# Altium footprint library ref-packages.PCBLIB: 1544 footprints (part 41 of 103)
Each footprint in its own frame and in the unit in brackets; x right, y up, seen from the top. Pads: shape width x height; smd on the part's side, far side on the other; paste and mask are expansions set on the pad; w line width, h text height; cw(c..) or ccw(c..) is an arc to the next point about the centre after c.
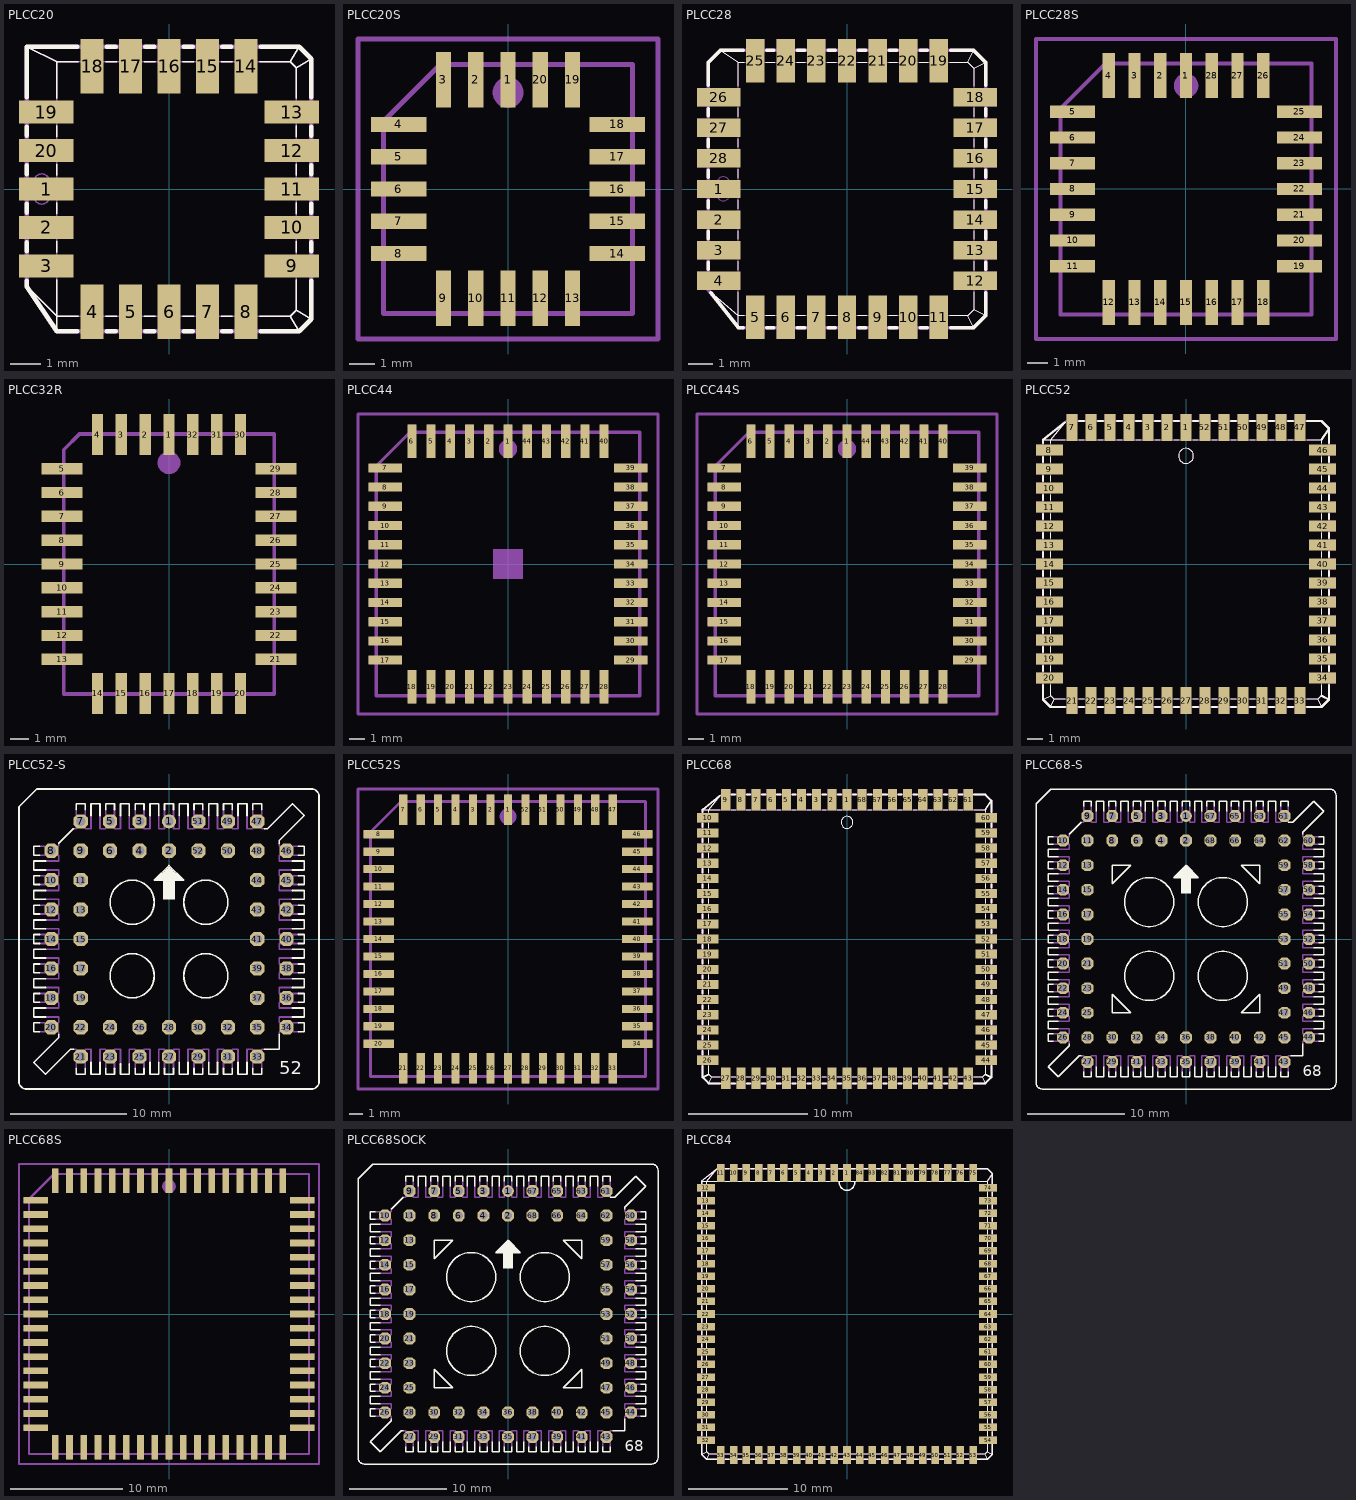
[diagram p40: the footprints below, top view; thin cyan lines are the x and y axes]

## PLCC20 [mil]
pads (20):
  rect 70.87x29.92 smd: 1(-159.45,0) 2(-159.45,-50) 3(-159.45,-100) 9(159.45,-100) 10(159.45,-50) 11(159.45,0) 12(159.45,50) 13(159.45,100) 19(-159.45,100) 20(-159.45,50)
  rect 29.92x70.87 smd: 4(-100,-159.45) 5(-50,-159.45) 6(0,-159.45) 7(50,-159.45) 8(100,-159.45) 14(100,159.45) 15(50,159.45) 16(0,159.45) 17(-50,159.45) 18(-100,159.45)
Top Overlay:
  lines w2: -185.04,185.04 -145.67,165.35 ; -184.65,-126.38 -145.67,-165.35 ; -145.67,-184.65 -145.67,-165.35 ; -145.67,-117.76 -145.67,-165.35 ; -145.67,-82.24 -145.67,-67.76 ; -145.67,-32.24 -145.67,-17.76 ; -145.67,17.76 -145.67,32.24 ; -145.67,67.76 -145.67,82.24 ; -145.67,117.76 -145.67,165.35 ; -117.76,-165.35 -145.67,-165.35 ; -117.76,165.35 -145.67,165.35 ; -82.24,-165.35 -67.76,-165.35 ; -82.24,165.35 -67.76,165.35 ; -32.24,-165.35 -17.76,-165.35 ; -32.24,165.35 -17.76,165.35 ; 17.76,-165.35 32.24,-165.35 ; 17.76,165.35 32.24,165.35 ; 67.76,-165.35 82.24,-165.35 ; 67.76,165.35 82.24,165.35 ; 117.76,-165.35 157.48,-165.35 ; 117.76,165.35 157.48,165.35 ; 165.35,-117.76 165.35,-157.48 ; 165.35,-82.24 165.35,-67.76 ; 165.35,-32.24 165.35,-17.76 ; 165.35,17.76 165.35,32.24 ; 165.35,67.76 165.35,82.24 ; 165.35,117.76 165.35,157.48 ; 169.29,-185.04 157.48,-165.35 ; 169.29,185.04 157.48,165.35 ; 185.04,-169.29 165.35,-157.48 ; 185.04,169.29 165.35,157.48 ; 157.48,-165.35 165.35,-157.48 ; 157.48,165.35 165.35,157.48
  lines w6: -185.04,-119.33 -185.04,-126.38 -145.67,-185.04 -119.33,-185.04 ; -185.04,-80.67 -185.04,-69.33 ; -185.04,-30.67 -185.04,-19.33 ; -185.04,19.33 -185.04,30.67 ; -185.04,69.33 -185.04,80.67 ; -185.04,119.33 -185.04,185.04 -119.33,185.04 ; -80.67,-185.04 -69.33,-185.04 ; -80.67,185.04 -69.33,185.04 ; -30.67,-185.04 -19.33,-185.04 ; -30.67,185.04 -19.33,185.04 ; 19.33,-185.04 30.67,-185.04 ; 19.33,185.04 30.67,185.04 ; 69.33,-185.04 80.67,-185.04 ; 69.33,185.04 80.67,185.04 ; 119.33,-185.04 169.29,-185.04 185.04,-169.29 185.04,-119.33 ; 119.33,185.04 169.29,185.04 185.04,169.29 185.04,119.33 ; 185.04,-80.67 185.04,-69.33 ; 185.04,-30.67 185.04,-19.33 ; 185.04,19.33 185.04,30.67 ; 185.04,69.33 185.04,80.67
Mechanical 16:
  rectangle: -109.84,-194.88 -90.16,-185.04
  rectangle: -109.84,185.04 -90.16,194.88
  rectangle: -59.84,185.04 -40.16,194.88
  rectangle: -9.84,185.04 9.84,194.88
  rectangle: 40.16,185.04 59.84,194.88
  rectangle: 90.16,185.04 109.84,194.88
  rectangle: 40.16,185.04 59.84,194.88
  rectangle: -9.84,185.04 9.84,194.88
  rectangle: 185.04,90.16 194.88,109.84
  rectangle: 185.04,40.16 194.88,59.84
  rectangle: 185.04,-9.84 194.88,9.84
  rectangle: 185.04,-59.84 194.88,-40.16
  rectangle: 185.04,-109.84 194.88,-90.16
  rectangle: -59.84,-194.88 -40.16,-185.04
  rectangle: -9.84,-194.88 9.84,-185.04
  rectangle: 40.16,-194.88 59.84,-185.04
  rectangle: 90.16,-194.88 109.84,-185.04
  rectangle: -194.88,90.16 -185.04,109.84
  rectangle: -194.88,40.16 -185.04,59.84
  rectangle: -194.88,-9.84 -185.04,9.84
  rectangle: -194.88,-59.84 -185.04,-40.16
  rectangle: -194.88,-109.84 -185.04,-90.16
  lines w2: -185.04,-125.98 -145.67,-165.35 ; -185.04,185.04 -145.67,165.35 ; 169.29,-185.04 157.48,-165.35 ; 169.29,185.04 157.48,165.35 ; 185.04,-169.29 165.35,-157.48 ; 185.04,169.29 165.35,157.48 ; -145.67,-165.35 157.48,-165.35 ; -145.67,-165.35 -145.67,165.35 ; -145.67,165.35 157.48,165.35 ; 157.48,-165.35 165.35,-157.48 ; 157.48,165.35 165.35,157.48 ; 165.35,-157.48 165.35,157.48 ; -175.2,-9.84 ccw(c-165.35,-9.84) -155.51,-9.84 -155.51,9.84 ccw(c-165.35,9.84) -175.2,9.84 -175.2,-9.84
  lines w6: -185.04,-125.98 -185.04,185.04 169.29,185.04 185.04,169.29 185.04,-169.29 169.29,-185.04 -145.67,-185.04 -185.04,-125.98

## PLCC20S [mil]
pads (20):
  rect 23.62x86.61 smd: 1(0,169.29) 2(-50,169.29) 3(-100,169.29) 9(-100,-169.29) 10(-50,-169.29) 11(0,-169.29) 12(50,-169.29) 13(100,-169.29) 19(100,169.29) 20(50,169.29)
  rect 86.61x23.62 smd: 4(-169.29,100) 5(-169.29,50) 6(-169.29,0) 7(-169.29,-50) 8(-169.29,-100) 14(169.29,-100) 15(169.29,-50) 16(169.29,0) 17(169.29,50) 18(169.29,100)
Mechanical 16:
  circle w24: c0,149.61 r11.81
  rectangle: -10.24,194.88 10.24,212.6
  rectangle: -60.24,194.88 -39.76,212.6
  rectangle: -110.24,194.88 -89.76,212.6
  rectangle: -212.6,89.76 -194.88,110.24
  rectangle: -212.6,39.76 -194.88,60.24
  rectangle: -212.6,-10.24 -194.88,10.24
  rectangle: -212.6,-60.24 -194.88,-39.76
  rectangle: -212.6,-110.24 -194.88,-89.76
  rectangle: -110.24,-212.6 -89.76,-194.88
  rectangle: -60.24,-212.6 -39.76,-194.88
  rectangle: -10.24,-212.6 10.24,-194.88
  rectangle: 39.76,-212.6 60.24,-194.88
  rectangle: 89.76,-212.6 110.24,-194.88
  rectangle: 194.88,-110.24 212.6,-89.76
  rectangle: 194.88,-60.24 212.6,-39.76
  rectangle: 194.88,-10.24 212.6,10.24
  rectangle: 194.88,39.76 212.6,60.24
  rectangle: 194.88,89.76 212.6,110.24
  rectangle: 89.76,194.88 110.24,212.6
  rectangle: 39.76,194.88 60.24,212.6
  lines w8: -192.91,-192.91 -192.91,104.92 -104.92,192.91 192.91,192.91 192.91,-192.91 -192.91,-192.91
Mechanical 27:
  lines w7.87: -232.4,-232.4 232.4,-232.4 232.4,232.4 -232.4,232.4 -232.4,-232.4

## PLCC28 [mil]
pads (28):
  rect 70.87x29.92 smd: 1(-209.45,0) 2(-209.45,-50) 3(-209.45,-100) 4(-209.45,-150) 12(209.45,-150) 13(209.45,-100) 14(209.45,-50) 15(209.45,0) 16(209.45,50) 17(209.45,100) 18(209.45,150) 26(-209.45,150) 27(-209.45,100) 28(-209.45,50)
  rect 29.92x70.87 smd: 5(-150,-209.45) 6(-100,-209.45) 7(-50,-209.45) 8(0,-209.45) 9(50,-209.45) 10(100,-209.45) 11(150,-209.45) 19(150,209.45) 20(100,209.45) 21(50,209.45) 22(0,209.45) 23(-50,209.45) 24(-100,209.45) 25(-150,209.45)
Top Overlay:
  lines w2: -223.58,-167.76 -177.17,-206.69 ; -206.69,226.38 -177.17,206.69 ; -177.17,-226.38 -177.17,-206.69 ; -177.17,-167.76 -177.17,-206.69 ; -177.17,-132.24 -177.17,-117.76 ; -177.17,-82.24 -177.17,-67.76 ; -177.17,-32.24 -177.17,-17.76 ; -177.17,17.76 -177.17,32.24 ; -177.17,67.76 -177.17,82.24 ; -177.17,117.76 -177.17,132.24 ; -177.17,167.76 -177.17,206.69 ; -167.76,-206.69 -177.17,-206.69 ; -167.76,206.69 -177.17,206.69 ; -132.24,-206.69 -117.76,-206.69 ; -132.24,206.69 -117.76,206.69 ; -82.24,-206.69 -67.76,-206.69 ; -82.24,206.69 -67.76,206.69 ; -32.24,-206.69 -17.76,-206.69 ; -32.24,206.69 -17.76,206.69 ; 17.76,-206.69 32.24,-206.69 ; 17.76,206.69 32.24,206.69 ; 67.76,-206.69 82.24,-206.69 ; 67.76,206.69 82.24,206.69 ; 117.76,-206.69 132.24,-206.69 ; 117.76,206.69 132.24,206.69 ; 167.76,-206.69 196.85,-206.69 ; 167.76,206.69 196.85,206.69 ; 206.69,-226.38 196.85,-206.69 ; 206.69,-167.76 206.69,-196.85 ; 206.69,-132.24 206.69,-117.76 ; 206.69,-82.24 206.69,-67.76 ; 206.69,-32.24 206.69,-17.76 ; 206.69,17.76 206.69,32.24 ; 206.69,67.76 206.69,82.24 ; 206.69,117.76 206.69,132.24 ; 206.69,167.76 206.69,196.85 ; 206.69,226.38 196.85,206.69 ; 226.38,-206.69 206.69,-196.85 ; 226.38,206.69 206.69,196.85 ; 196.85,-206.69 206.69,-196.85 ; 196.85,206.69 206.69,196.85
  lines w6: -226.38,-130.67 -226.38,-119.33 ; -226.38,-80.67 -226.38,-69.33 ; -226.38,-30.67 -226.38,-19.33 ; -226.38,19.33 -226.38,30.67 ; -226.38,69.33 -226.38,80.67 ; -226.38,119.33 -226.38,130.67 ; -226.38,169.33 -226.38,206.69 -206.69,226.38 -169.33,226.38 ; -222.4,-169.33 -177.17,-226.38 -169.33,-226.38 ; -130.67,-226.38 -119.33,-226.38 ; -130.67,226.38 -119.33,226.38 ; -80.67,-226.38 -69.33,-226.38 ; -80.67,226.38 -69.33,226.38 ; -30.67,-226.38 -19.33,-226.38 ; -30.67,226.38 -19.33,226.38 ; 19.33,-226.38 30.67,-226.38 ; 19.33,226.38 30.67,226.38 ; 69.33,-226.38 80.67,-226.38 ; 69.33,226.38 80.67,226.38 ; 119.33,-226.38 130.67,-226.38 ; 119.33,226.38 130.67,226.38 ; 169.33,-226.38 206.69,-226.38 226.38,-206.69 226.38,-169.33 ; 169.33,226.38 206.69,226.38 226.38,206.69 226.38,169.33 ; 226.38,-130.67 226.38,-119.33 ; 226.38,-80.67 226.38,-69.33 ; 226.38,-30.67 226.38,-19.33 ; 226.38,19.33 226.38,30.67 ; 226.38,69.33 226.38,80.67 ; 226.38,119.33 226.38,130.67
Mechanical 16:
  rectangle: -164.96,226.38 -135.04,244.88
  rectangle: -114.96,226.38 -85.04,244.88
  rectangle: -64.96,226.38 -35.04,244.88
  rectangle: -14.96,226.38 14.96,244.88
  rectangle: 35.04,226.38 64.96,244.88
  rectangle: 85.04,226.38 114.96,244.88
  rectangle: 135.04,226.38 164.96,244.88
  rectangle: 226.38,135.04 244.88,164.96
  rectangle: 226.38,85.04 244.88,114.96
  rectangle: 226.38,35.04 244.88,64.96
  rectangle: 226.38,-14.96 244.88,14.96
  rectangle: 226.38,-64.96 244.88,-35.04
  rectangle: 226.38,-114.96 244.88,-85.04
  rectangle: 226.38,-164.96 244.88,-135.04
  rectangle: -164.96,-244.88 -135.04,-226.38
  rectangle: -114.96,-244.88 -85.04,-226.38
  rectangle: -64.96,-244.88 -35.04,-226.38
  rectangle: -14.96,-244.88 14.96,-226.38
  rectangle: 35.04,-244.88 64.96,-226.38
  rectangle: 85.04,-244.88 114.96,-226.38
  rectangle: 135.04,-244.88 164.96,-226.38
  rectangle: -244.88,135.04 -226.38,164.96
  rectangle: -244.88,85.04 -226.38,114.96
  rectangle: -244.88,35.04 -226.38,64.96
  rectangle: -244.88,-14.96 -226.38,14.96
  rectangle: -244.88,-64.96 -226.38,-35.04
  rectangle: -244.88,-114.96 -226.38,-85.04
  rectangle: -244.88,-164.96 -226.38,-135.04
  lines w2: -226.38,-164.96 -177.17,-206.69 ; -206.69,226.38 -177.17,206.69 ; -177.17,-226.38 -177.17,-206.69 ; 206.69,-226.38 196.85,-206.69 ; 206.69,226.38 196.85,206.69 ; 226.38,-206.69 206.69,-196.85 ; 226.38,206.69 206.69,196.85 ; -177.17,-206.69 196.85,-206.69 ; -177.17,-206.69 -177.17,206.69 ; -177.17,206.69 196.85,206.69 ; 196.85,-206.69 206.69,-196.85 ; 196.85,206.69 206.69,196.85 ; 206.69,-196.85 206.69,196.85 ; -211.81,-9.65 ccw(c-201.97,-9.65) -192.13,-9.65 -192.13,10.04 ccw(c-201.97,10.04) -211.81,10.04 -211.81,-9.65
  lines w6: -226.38,-164.96 -177.17,-226.38 206.69,-226.38 226.38,-206.69 226.38,206.69 206.69,226.38 -206.69,226.38 -226.38,206.69 -226.38,-164.96

## PLCC28S [mil]
pads (28):
  rect 23.62x86.61 smd: 1(0,220.47) 2(-50,220.47) 3(-100,220.47) 4(-150,220.47) 12(-150,-220.47) 13(-100,-220.47) 14(-50,-220.47) 15(0,-220.47) 16(50,-220.47) 17(100,-220.47) 18(150,-220.47) 26(150,220.47) 27(100,220.47) 28(50,220.47)
  rect 86.61x23.62 smd: 5(-220.47,150) 6(-220.47,100) 7(-220.47,50) 8(-220.47,0) 9(-220.47,-50) 10(-220.47,-100) 11(-220.47,-150) 19(220.47,-150) 20(220.47,-100) 21(220.47,-50) 22(220.47,0) 23(220.47,50) 24(220.47,100) 25(220.47,150)
Mechanical 16:
  circle w24: c0,200.79 r11.81
  rectangle: -10.24,246.06 10.24,263.78
  rectangle: -60.24,246.06 -39.76,263.78
  rectangle: -110.24,246.06 -89.76,263.78
  rectangle: -160.24,246.06 -139.76,263.78
  rectangle: -263.78,139.76 -246.06,160.24
  rectangle: -263.78,89.76 -246.06,110.24
  rectangle: -263.78,39.76 -246.06,60.24
  rectangle: -263.78,-10.24 -246.06,10.24
  rectangle: -263.78,-60.24 -246.06,-39.76
  rectangle: -263.78,-110.24 -246.06,-89.76
  rectangle: -263.78,-160.24 -246.06,-139.76
  rectangle: -160.24,-263.78 -139.76,-246.06
  rectangle: -110.24,-263.78 -89.76,-246.06
  rectangle: -60.24,-263.78 -39.76,-246.06
  rectangle: -10.24,-263.78 10.24,-246.06
  rectangle: 39.76,-263.78 60.24,-246.06
  rectangle: 89.76,-263.78 110.24,-246.06
  rectangle: 139.76,-263.78 160.24,-246.06
  rectangle: 246.06,-160.24 263.78,-139.76
  rectangle: 246.06,-110.24 263.78,-89.76
  rectangle: 246.06,-60.24 263.78,-39.76
  rectangle: 246.06,-10.24 263.78,10.24
  rectangle: 246.06,39.76 263.78,60.24
  rectangle: 246.06,89.76 263.78,110.24
  rectangle: 246.06,139.76 263.78,160.24
  rectangle: 139.76,246.06 160.24,263.78
  rectangle: 89.76,246.06 110.24,263.78
  rectangle: 39.76,246.06 60.24,263.78
  lines w8: -244.09,-244.09 -244.09,156.1 -156.1,244.09 244.09,244.09 244.09,-244.09 -244.09,-244.09
Mechanical 27:
  lines w7.87: -291.46,-291.46 291.46,-291.46 291.46,291.46 -291.46,291.46 -291.46,-291.46

## PLCC32R [mm]
pads (32):
  rect 0.6x2.2 smd: 1(0,6.9) 2(-1.27,6.9) 3(-2.54,6.9) 4(-3.81,6.9) 14(-3.81,-6.9) 15(-2.54,-6.9) 16(-1.27,-6.9) 17(0,-6.9) 18(1.27,-6.9) 19(2.54,-6.9) 20(3.81,-6.9) 30(3.81,6.9) 31(2.54,6.9) 32(1.27,6.9)
  rect 2.2x0.6 smd: 5(-5.7,5.08) 6(-5.7,3.81) 7(-5.7,2.54) 8(-5.7,1.27) 9(-5.7,0) 10(-5.7,-1.27) 11(-5.7,-2.54) 12(-5.7,-3.81) 13(-5.7,-5.08) 21(5.7,-5.08) 22(5.7,-3.81) 23(5.7,-2.54) 24(5.7,-1.27) 25(5.7,0) 26(5.7,1.27) 27(5.7,2.54) 28(5.7,3.81) 29(5.7,5.08)
Mechanical 16:
  circle w0.61: c0,5.4 r0.3
  rectangle: -0.26,6.95 0.27,7.53
  rectangle: -1.53,6.95 -1,7.53
  rectangle: -2.8,6.95 -2.27,7.53
  rectangle: -4.07,6.95 -3.54,7.53
  rectangle: -6.33,4.82 -5.75,5.35
  rectangle: -6.33,3.55 -5.75,4.08
  rectangle: -6.33,2.28 -5.75,2.81
  rectangle: -6.33,1.01 -5.75,1.54
  rectangle: -6.33,-0.26 -5.75,0.27
  rectangle: -6.33,-1.53 -5.75,-1
  rectangle: -6.33,-2.8 -5.75,-2.27
  rectangle: -6.33,-4.07 -5.75,-3.54
  rectangle: -6.33,-5.34 -5.75,-4.81
  rectangle: -4.08,-7.53 -3.55,-6.95
  rectangle: -2.81,-7.53 -2.28,-6.95
  rectangle: -1.54,-7.53 -1.01,-6.95
  rectangle: -0.27,-7.53 0.26,-6.95
  rectangle: 1,-7.53 1.53,-6.95
  rectangle: 2.27,-7.53 2.8,-6.95
  rectangle: 3.54,-7.53 4.07,-6.95
  rectangle: 5.75,-5.35 6.33,-4.82
  rectangle: 5.75,-4.08 6.33,-3.55
  rectangle: 5.75,-2.81 6.33,-2.28
  rectangle: 5.75,-1.54 6.33,-1.01
  rectangle: 5.75,-0.27 6.33,0.26
  rectangle: 5.75,1 6.33,1.53
  rectangle: 5.75,2.27 6.33,2.8
  rectangle: 5.75,3.54 6.33,4.07
  rectangle: 5.75,4.81 6.33,5.34
  rectangle: 3.55,6.95 4.08,7.53
  rectangle: 2.28,6.95 2.81,7.53
  rectangle: 1.01,6.95 1.54,7.53
  lines w0.203: -5.61,-6.93 5.61,-6.93 5.61,6.93 -4.77,6.93 -5.61,6.09 -5.61,-6.93

## PLCC44 [mil]
pads (44):
  rect 23.62x86.61 smd: 1(0,318.9) 2(-50,318.9) 3(-100,318.9) 4(-150,318.9) 5(-200,318.9) 6(-250,318.9) 18(-250,-318.9) 19(-200,-318.9) 20(-150,-318.9) 21(-100,-318.9) 22(-50,-318.9) 23(0,-318.9) 24(50,-318.9) 25(100,-318.9) 26(150,-318.9) 27(200,-318.9) 28(250,-318.9) 40(250,318.9) 41(200,318.9) 42(150,318.9) 43(100,318.9) 44(50,318.9)
  rect 86.61x23.62 smd: 7(-318.9,250) 8(-318.9,200) 9(-318.9,150) 10(-318.9,100) 11(-318.9,50) 12(-318.9,0) 13(-318.9,-50) 14(-318.9,-100) 15(-318.9,-150) 16(-318.9,-200) 17(-318.9,-250) 29(318.9,-250) 30(318.9,-200) 31(318.9,-150) 32(318.9,-100) 33(318.9,-50) 34(318.9,0) 35(318.9,50) 36(318.9,100) 37(318.9,150) 38(318.9,200) 39(318.9,250)
Mechanical 6:
  rectangle: -39.37,-39.37 39.37,39.37
Mechanical 16:
  circle w24: c0,299.21 r11.81
  rectangle: -10.24,344.49 10.24,362.2
  rectangle: -60.24,344.49 -39.76,362.2
  rectangle: -110.24,344.49 -89.76,362.2
  rectangle: -160.24,344.49 -139.76,362.2
  rectangle: -210.24,344.49 -189.76,362.2
  rectangle: -260.24,344.49 -239.76,362.2
  rectangle: -362.2,239.76 -344.49,260.24
  rectangle: -362.2,189.76 -344.49,210.24
  rectangle: -362.2,139.76 -344.49,160.24
  rectangle: -362.2,89.76 -344.49,110.24
  rectangle: -362.2,39.76 -344.49,60.24
  rectangle: -362.2,-10.24 -344.49,10.24
  rectangle: -362.2,-60.24 -344.49,-39.76
  rectangle: -362.2,-110.24 -344.49,-89.76
  rectangle: -362.2,-160.24 -344.49,-139.76
  rectangle: -362.2,-210.24 -344.49,-189.76
  rectangle: -362.2,-260.24 -344.49,-239.76
  rectangle: -260.24,-362.2 -239.76,-344.49
  rectangle: -210.24,-362.2 -189.76,-344.49
  rectangle: -160.24,-362.2 -139.76,-344.49
  rectangle: -110.24,-362.2 -89.76,-344.49
  rectangle: -60.24,-362.2 -39.76,-344.49
  rectangle: -10.24,-362.2 10.24,-344.49
  rectangle: 39.76,-362.2 60.24,-344.49
  rectangle: 89.76,-362.2 110.24,-344.49
  rectangle: 139.76,-362.2 160.24,-344.49
  rectangle: 189.76,-362.2 210.24,-344.49
  rectangle: 239.76,-362.2 260.24,-344.49
  rectangle: 344.49,-260.24 362.2,-239.76
  rectangle: 344.49,-210.24 362.2,-189.76
  rectangle: 344.49,-160.24 362.2,-139.76
  rectangle: 344.49,-110.24 362.2,-89.76
  rectangle: 344.49,-60.24 362.2,-39.76
  rectangle: 344.49,-10.24 362.2,10.24
  rectangle: 344.49,39.76 362.2,60.24
  rectangle: 344.49,89.76 362.2,110.24
  rectangle: 344.49,139.76 362.2,160.24
  rectangle: 344.49,189.76 362.2,210.24
  rectangle: 344.49,239.76 362.2,260.24
  rectangle: 239.76,344.49 260.24,362.2
  rectangle: 189.76,344.49 210.24,362.2
  rectangle: 139.76,344.49 160.24,362.2
  rectangle: 89.76,344.49 110.24,362.2
  rectangle: 39.76,344.49 60.24,362.2
  lines w8: -342.52,-342.52 -342.52,254.53 -254.53,342.52 342.52,342.52 342.52,-342.52 -342.52,-342.52
  text "IPC PLCC-44 Suare" at -234.65,168.11 h37.2
Mechanical 27:
  lines w7.87: -389.88,-389.88 389.88,-389.88 389.88,389.88 -389.88,389.88 -389.88,-389.88

## PLCC44S [mil]
pads (44):
  rect 23.62x86.61 smd: 1(0,318.9) 2(-50,318.9) 3(-100,318.9) 4(-150,318.9) 5(-200,318.9) 6(-250,318.9) 18(-250,-318.9) 19(-200,-318.9) 20(-150,-318.9) 21(-100,-318.9) 22(-50,-318.9) 23(0,-318.9) 24(50,-318.9) 25(100,-318.9) 26(150,-318.9) 27(200,-318.9) 28(250,-318.9) 40(250,318.9) 41(200,318.9) 42(150,318.9) 43(100,318.9) 44(50,318.9)
  rect 86.61x23.62 smd: 7(-318.9,250) 8(-318.9,200) 9(-318.9,150) 10(-318.9,100) 11(-318.9,50) 12(-318.9,0) 13(-318.9,-50) 14(-318.9,-100) 15(-318.9,-150) 16(-318.9,-200) 17(-318.9,-250) 29(318.9,-250) 30(318.9,-200) 31(318.9,-150) 32(318.9,-100) 33(318.9,-50) 34(318.9,0) 35(318.9,50) 36(318.9,100) 37(318.9,150) 38(318.9,200) 39(318.9,250)
Mechanical 16:
  circle w24: c0,299.21 r11.81
  rectangle: -10.24,344.49 10.24,362.2
  rectangle: -60.24,344.49 -39.76,362.2
  rectangle: -110.24,344.49 -89.76,362.2
  rectangle: -160.24,344.49 -139.76,362.2
  rectangle: -210.24,344.49 -189.76,362.2
  rectangle: -260.24,344.49 -239.76,362.2
  rectangle: -362.2,239.76 -344.49,260.24
  rectangle: -362.2,189.76 -344.49,210.24
  rectangle: -362.2,139.76 -344.49,160.24
  rectangle: -362.2,89.76 -344.49,110.24
  rectangle: -362.2,39.76 -344.49,60.24
  rectangle: -362.2,-10.24 -344.49,10.24
  rectangle: -362.2,-60.24 -344.49,-39.76
  rectangle: -362.2,-110.24 -344.49,-89.76
  rectangle: -362.2,-160.24 -344.49,-139.76
  rectangle: -362.2,-210.24 -344.49,-189.76
  rectangle: -362.2,-260.24 -344.49,-239.76
  rectangle: -260.24,-362.2 -239.76,-344.49
  rectangle: -210.24,-362.2 -189.76,-344.49
  rectangle: -160.24,-362.2 -139.76,-344.49
  rectangle: -110.24,-362.2 -89.76,-344.49
  rectangle: -60.24,-362.2 -39.76,-344.49
  rectangle: -10.24,-362.2 10.24,-344.49
  rectangle: 39.76,-362.2 60.24,-344.49
  rectangle: 89.76,-362.2 110.24,-344.49
  rectangle: 139.76,-362.2 160.24,-344.49
  rectangle: 189.76,-362.2 210.24,-344.49
  rectangle: 239.76,-362.2 260.24,-344.49
  rectangle: 344.49,-260.24 362.2,-239.76
  rectangle: 344.49,-210.24 362.2,-189.76
  rectangle: 344.49,-160.24 362.2,-139.76
  rectangle: 344.49,-110.24 362.2,-89.76
  rectangle: 344.49,-60.24 362.2,-39.76
  rectangle: 344.49,-10.24 362.2,10.24
  rectangle: 344.49,39.76 362.2,60.24
  rectangle: 344.49,89.76 362.2,110.24
  rectangle: 344.49,139.76 362.2,160.24
  rectangle: 344.49,189.76 362.2,210.24
  rectangle: 344.49,239.76 362.2,260.24
  rectangle: 239.76,344.49 260.24,362.2
  rectangle: 189.76,344.49 210.24,362.2
  rectangle: 139.76,344.49 160.24,362.2
  rectangle: 89.76,344.49 110.24,362.2
  rectangle: 39.76,344.49 60.24,362.2
  lines w8: -342.52,-342.52 -342.52,254.53 -254.53,342.52 342.52,342.52 342.52,-342.52 -342.52,-342.52
Mechanical 27:
  lines w7.87: -389.88,-389.88 389.88,-389.88 389.88,389.88 -389.88,389.88 -389.88,-389.88

## PLCC52 [mil]
pads (52):
  rect 29.92x70.87 smd: 1(0,359.45) 2(-50,359.45) 3(-100,359.45) 4(-150,359.45) 5(-200,359.45) 6(-250,359.45) 7(-300,359.45) 21(-300,-359.45) 22(-250,-359.45) 23(-200,-359.45) 24(-150,-359.45) 25(-100,-359.45) 26(-50,-359.45) 27(0,-359.45) 28(50,-359.45) 29(100,-359.45) 30(150,-359.45) 31(200,-359.45) 32(250,-359.45) 33(300,-359.45) 47(300,359.45) 48(250,359.45) 49(200,359.45) 50(150,359.45) 51(100,359.45) 52(50,359.45)
  rect 70.87x29.92 smd: 8(-359.45,300) 9(-359.45,250) 10(-359.45,200) 11(-359.45,150) 12(-359.45,100) 13(-359.45,50) 14(-359.45,0) 15(-359.45,-50) 16(-359.45,-100) 17(-359.45,-150) 18(-359.45,-200) 19(-359.45,-250) 20(-359.45,-300) 34(359.45,-300) 35(359.45,-250) 36(359.45,-200) 37(359.45,-150) 38(359.45,-100) 39(359.45,-50) 40(359.45,0) 41(359.45,50) 42(359.45,100) 43(359.45,150) 44(359.45,200) 45(359.45,250) 46(359.45,300)
Top Overlay:
  circle w2: c0,284.65 r19.69
  lines w2: -376.38,-356.69 -356.69,-346.85 ; -376.38,327.17 -356.69,327.17 ; -356.69,-376.38 -346.85,-356.69 ; -356.69,-317.76 -356.69,-346.85 ; -356.69,-282.24 -356.69,-267.76 ; -356.69,-232.24 -356.69,-217.76 ; -356.69,-182.24 -356.69,-167.76 ; -356.69,-132.24 -356.69,-117.76 ; -356.69,-82.24 -356.69,-67.76 ; -356.69,-32.24 -356.69,-17.76 ; -356.69,17.76 -356.69,32.24 ; -356.69,67.76 -356.69,82.24 ; -356.69,117.76 -356.69,132.24 ; -356.69,167.76 -356.69,182.24 ; -356.69,217.76 -356.69,232.24 ; -356.69,267.76 -356.69,282.24 ; -356.69,317.76 -356.69,327.17 ; -319.76,371.57 -356.69,327.17 ; -317.76,-356.69 -346.85,-356.69 ; -317.76,327.17 -356.69,327.17 ; -282.24,-356.69 -267.76,-356.69 ; -282.24,327.17 -267.76,327.17 ; -232.24,-356.69 -217.76,-356.69 ; -232.24,327.17 -217.76,327.17 ; -182.24,-356.69 -167.76,-356.69 ; -182.24,327.17 -167.76,327.17 ; -132.24,-356.69 -117.76,-356.69 ; -132.24,327.17 -117.76,327.17 ; -82.24,-356.69 -67.76,-356.69 ; -82.24,327.17 -67.76,327.17 ; -32.24,-356.69 -17.76,-356.69 ; -32.24,327.17 -17.76,327.17 ; 17.76,-356.69 32.24,-356.69 ; 17.76,327.17 32.24,327.17 ; 67.76,-356.69 82.24,-356.69 ; 67.76,327.17 82.24,327.17 ; 117.76,-356.69 132.24,-356.69 ; 117.76,327.17 132.24,327.17 ; 167.76,-356.69 182.24,-356.69 ; 167.76,327.17 182.24,327.17 ; 217.76,-356.69 232.24,-356.69 ; 217.76,327.17 232.24,327.17 ; 267.76,-356.69 282.24,-356.69 ; 267.76,327.17 282.24,327.17 ; 317.76,-356.69 346.85,-356.69 ; 317.76,327.17 356.69,327.17 356.69,317.76 ; 356.69,-376.38 346.85,-356.69 ; 356.69,-317.76 356.69,-346.85 346.85,-356.69 ; 356.69,-282.24 356.69,-267.76 ; 356.69,-232.24 356.69,-217.76 ; 356.69,-182.24 356.69,-167.76 ; 356.69,-132.24 356.69,-117.76 ; 356.69,-82.24 356.69,-67.76 ; 356.69,-32.24 356.69,-17.76 ; 356.69,17.76 356.69,32.24 ; 356.69,67.76 356.69,82.24 ; 356.69,117.76 356.69,132.24 ; 356.69,167.76 356.69,182.24 ; 356.69,217.76 356.69,232.24 ; 356.69,267.76 356.69,282.24 ; -356.69,-346.85 -346.85,-356.69